# Altium footprint library IS-IG-BB.PcbLib: 6 footprints
Each footprint in its own frame and in the unit in brackets; x right, y up, seen from the top. Pads: shape width x height; smd on the part's side, far side on the other; paste and mask are expansions set on the pad; w line width, h text height; cw(c..) or ccw(c..) is an arc to the next point about the centre after c.
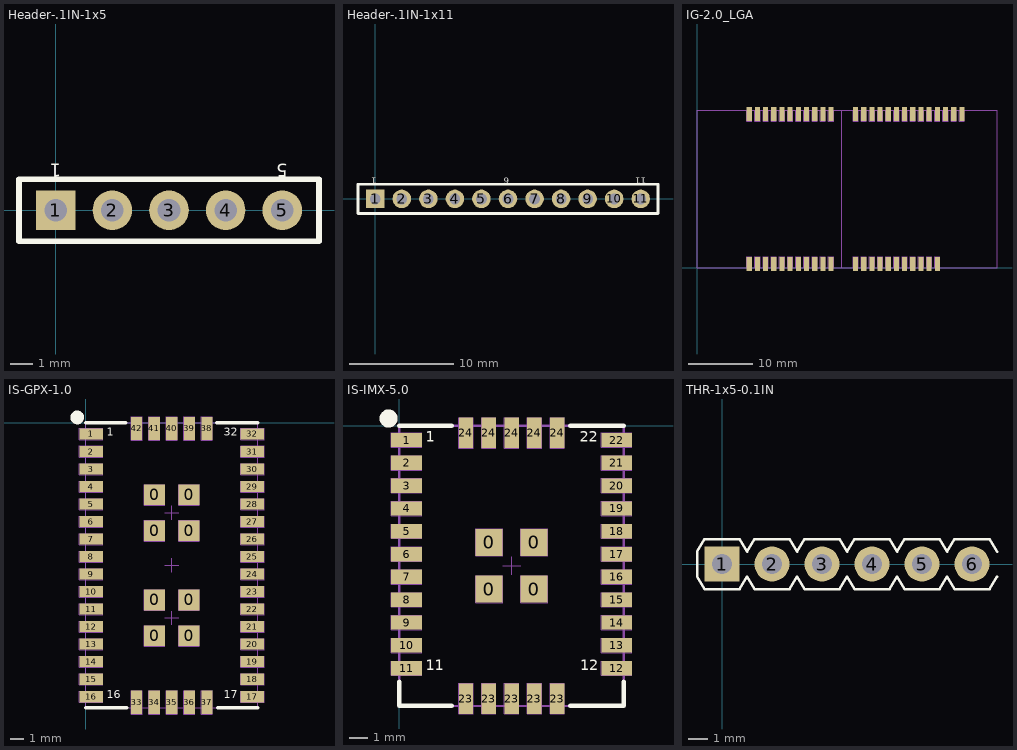
[diagram p0: the footprints below, top view; thin cyan lines are the x and y axes]

## Header-.1IN-1x5 [mil]
pads (5):
  rect 70x70 hole 40: 1(0,0)
  round 70 hole 40: 2(100,0) 3(200,0) 4(300,0) 5(400,0)
Top Overlay:
  lines w10: -65,-55 -65,55 465,55 465,-55 -65,-55
  text "1" at 10,90 h40
  text "5" at 410,90 h40
Bottom Overlay:
  text "1" at -10,90 h40
  text "5" at 395,90 h40
3D body "ESQ-105-13-T-S.step": height 440, standoff -285, extent -60,-50 460,50

## Header-.1IN-1x11 [mil]
pads (11):
  rect 70x70 hole 40: 1(0,0)
  round 70 hole 40: 2(100,0) 3(200,0) 4(300,0) 5(400,0) 6(500,0) 7(600,0) 8(700,0) 9(800,0) 10(900,0) 11(1000,0)
Top Overlay:
  lines w10: -65,-55 1065,-55 1065,55 -65,55 -65,-55
  text "6" at 505,90 h40
  text "1" at 5,90 h40
  text "11" at 1020,90 h40
Bottom Overlay:
  text "6" at 490,90 h40
  text "1" at -10,90 h40
  text "11" at 980,90 h40
3D body "ESQ-111-13-T-S.step": height 440, standoff -285, extent -60,-50 1060,50

## IG-2.0_LGA [mm] "IMX multi-frequency RTK-GNSS Module"
height 5.93
pads (47):
  rect 0.8x2.2 smd paste-2.54: 0(8.123,23.9) 0(8.123,0.6) 0(9.393,23.9) 0(9.393,0.6) 0(10.663,23.9) 0(10.663,0.6) 0(11.933,23.9) 0(11.933,0.6) 0(13.203,23.9) 0(13.203,0.6) 0(14.473,23.9) 0(14.473,0.6) 0(15.743,23.9) 0(15.743,0.6) 0(17.013,23.9) 0(17.013,0.6) 0(18.283,23.9) 0(18.283,0.6) 0(19.553,23.9) 0(19.553,0.6) 0(20.823,23.9) 0(20.823,0.6) 1(41.143,23.9) 2(39.873,23.9) 3(38.603,23.9) 4(37.333,23.9) 5(36.063,23.9) 6(34.793,23.9) 7(33.523,23.9) 8(32.253,23.9) 9(30.983,23.9) 10(29.713,23.9) 11(28.443,23.9) 12(27.173,23.9) 13(25.903,23.9) 14(24.633,23.9) 15(24.633,0.6) 16(25.903,0.6) 17(27.173,0.6) 18(28.443,0.6) 19(29.713,0.6) 20(30.983,0.6) 21(32.253,0.6) 22(33.523,0.6) 23(34.793,0.6) 24(36.063,0.6) 25(37.333,0.6)
Mechanical 13:
  lines w0.127: 22.493,0 22.493,24.5 ; 0,0 0,24.5 46.6,24.5 46.6,0 0,0
Mechanical 16:
  drawing of 294 lines, arcs and shapes, not listed
3D body "IG-2.0.step": height 5.95, standoff 0.01, extent 0,-1.188 46.6,24.5

## IS-GPX-1.0 [mm] "Inerial Sense GPX-1.0, 42pins 1.27mm pitch"
height 2.86
pads (50):
  rect 1.5x1.5 smd: 0(5,-15.435) 0(5,-12.835) 0(5,-7.815) 0(5,-5.215) 0(7.5,-15.435) 0(7.5,-12.835) 0(7.5,-7.815) 0(7.5,-5.215)
  rect 1.7x0.8 smd paste-2.54: 1(0.4,-0.8) 2(0.4,-2.07) 3(0.4,-3.34) 4(0.4,-4.61) 5(0.4,-5.88) 6(0.4,-7.15) 7(0.4,-8.42) 8(0.4,-9.69) 9(0.4,-10.96) 10(0.4,-12.23) 11(0.4,-13.5) 12(0.4,-14.77) 13(0.4,-16.04) 14(0.4,-17.31) 15(0.4,-18.58) 16(0.4,-19.85) 17(12.1,-19.85) 18(12.1,-18.58) 19(12.1,-17.31) 20(12.1,-16.04) 21(12.1,-14.77) 22(12.1,-13.5) 23(12.1,-12.23) 24(12.1,-10.96) 25(12.1,-9.69) 26(12.1,-8.42) 27(12.1,-7.15) 28(12.1,-5.88) 29(12.1,-4.61) 30(12.1,-3.34) 31(12.1,-2.07) 32(12.1,-0.8)
  rect 0.8x1.7 smd paste-2.54: 33(3.71,-20.25) 34(4.98,-20.25) 35(6.25,-20.25) 36(7.52,-20.25) 37(8.79,-20.25) 38(8.79,-0.4) 39(7.52,-0.4) 40(6.25,-0.4) 41(4.98,-0.4) 42(3.71,-0.4)
Top Overlay:
  circle w0.5: c-0.6,0.4 r0.25
  lines w0.254: 0,-20.65 2.975,-20.65 ; 0,0 2.921,0 ; 9.525,0 12.5,0 ; 9.579,-20.65 12.5,-20.65
  text "1" at 1.524,-1.143 h1.02
  text "16" at 1.524,-20.193 h1.02
  text "17" at 10.033,-20.193 h1.02
  text "32" at 10.033,-1.143 h1.02
Mechanical 13:
  lines w0.05: 5.75,-10.325 6.75,-10.325 ; 5.75,-6.515 6.75,-6.515 ; 6.25,-10.825 6.25,-9.825 ; 6.25,-7.015 6.25,-6.015 ; 0,-20.65 0,0 12.5,0 12.5,-20.65 ; 0,-20.65 12.5,-20.65 ; 0,-20.65 12.5,-20.65 ; 5.75,-14.135 6.75,-14.135 5.75,-14.135 ; 6.25,-14.635 6.25,-13.635 6.25,-14.635
Mechanical 16:
  drawing of 200 lines, arcs and shapes, not listed
3D body "GPX-r1.0.3.step": height 2.88, standoff 0.01, extent 0,-20.65 12.5,0

## IS-IMX-5.0 [mm] "Inerial Sense IMX-5.0, 22pins 1.27mm pitch"
height 2.86
pads (36):
  rect 1.5x1.5 smd: 0(5,-9.1) 0(5,-6.5) 0(7.5,-9.1) 0(7.5,-6.5)
  rect 1.7x0.8 smd paste-2.54: 1(0.4,-0.8) 2(0.4,-2.07) 3(0.4,-3.34) 4(0.4,-4.61) 5(0.4,-5.88) 6(0.4,-7.15) 7(0.4,-8.42) 8(0.4,-9.69) 9(0.4,-10.96) 10(0.4,-12.23) 11(0.4,-13.5) 12(12.1,-13.5) 13(12.1,-12.23) 14(12.1,-10.96) 15(12.1,-9.69) 16(12.1,-8.42) 17(12.1,-7.15) 18(12.1,-5.88) 19(12.1,-4.61) 20(12.1,-3.34) 21(12.1,-2.07) 22(12.1,-0.8)
  rect 0.8x1.7 smd paste-2.54: 23(3.71,-15.2) 23(4.98,-15.2) 23(6.25,-15.2) 23(7.52,-15.2) 23(8.79,-15.2) 24(3.71,-0.4) 24(4.98,-0.4) 24(6.25,-0.4) 24(7.52,-0.4) 24(8.79,-0.4)
Top Overlay:
  circle w0.5: c-0.6,0.4 r0.25
  lines w0.254: 0,-14.25 0,-15.6 2.921,-15.6 ; 0,0 2.921,0 ; 9.525,-15.6 12.5,-15.6 ; 9.525,0 12.5,0 ; 12.5,-15.6 12.5,-14.25
  text "22" at 10.048,-1.1 h1.02
  text "12" at 10.075,-13.8 h1.02
  text "11" at 1.473,-13.8 h1.02
  text "1" at 1.473,-1.1 h1.02
Mechanical 13:
  lines w0.05: 5.75,-7.8 6.75,-7.8 ; 6.25,-8.3 6.25,-7.3
  lines w0.127: 0,-15.6 0,0 12.5,0 12.5,-15.6 0,-15.6
Mechanical 16:
  lines w0.025: -0.45,-13.9 -0.45,-13.1 1.25,-13.1 1.25,-13.9 -0.45,-13.9 ; -0.45,-12.63 -0.45,-11.83 1.25,-11.83 1.25,-12.63 -0.45,-12.63 ; -0.45,-11.36 -0.45,-10.56 1.25,-10.56 1.25,-11.36 -0.45,-11.36 ; -0.45,-10.09 -0.45,-9.29 1.25,-9.29 1.25,-10.09 -0.45,-10.09 ; -0.45,-8.82 -0.45,-8.02 1.25,-8.02 1.25,-8.82 -0.45,-8.82 ; -0.45,-7.55 -0.45,-6.75 1.25,-6.75 1.25,-7.55 -0.45,-7.55 ; -0.45,-6.28 -0.45,-5.48 1.25,-5.48 1.25,-6.28 -0.45,-6.28 ; -0.45,-5.01 -0.45,-4.21 1.25,-4.21 1.25,-5.01 -0.45,-5.01 ; -0.45,-3.74 -0.45,-2.94 1.25,-2.94 1.25,-3.74 -0.45,-3.74 ; -0.45,-2.47 -0.45,-1.67 1.25,-1.67 1.25,-2.47 -0.45,-2.47 ; -0.45,-1.2 -0.45,-0.4 1.25,-0.4 1.25,-1.2 -0.45,-1.2 ; 3.31,-16.05 4.11,-16.05 4.11,-14.35 3.31,-14.35 3.31,-16.05 ; 3.31,-1.25 3.31,0.45 4.11,0.45 4.11,-1.25 3.31,-1.25 ; 4.25,-9.85 5.75,-9.85 5.75,-8.35 4.25,-8.35 4.25,-9.85 ; 4.25,-7.25 5.75,-7.25 5.75,-5.75 4.25,-5.75 4.25,-7.25 ; 4.58,-16.05 5.38,-16.05 5.38,-14.35 4.58,-14.35 4.58,-16.05 ; 4.58,-1.25 4.58,0.45 5.38,0.45 5.38,-1.25 4.58,-1.25 ; 5.85,-16.05 6.65,-16.05 6.65,-14.35 5.85,-14.35 5.85,-16.05 ; 5.85,-1.25 5.85,0.45 6.65,0.45 6.65,-1.25 5.85,-1.25 ; 6.75,-9.85 6.75,-8.35 8.25,-8.35 8.25,-9.85 6.75,-9.85 ; 6.75,-7.25 6.75,-5.75 8.25,-5.75 8.25,-7.25 6.75,-7.25 ; 7.12,-16.05 7.92,-16.05 7.92,-14.35 7.12,-14.35 7.12,-16.05 ; 7.12,-1.25 7.12,0.45 7.92,0.45 7.92,-1.25 7.12,-1.25 ; 8.39,-16.05 9.19,-16.05 9.19,-14.35 8.39,-14.35 8.39,-16.05 ; 8.39,-1.25 8.39,0.45 9.19,0.45 9.19,-1.25 8.39,-1.25 ; 11.25,-13.9 12.95,-13.9 12.95,-13.1 11.25,-13.1 11.25,-13.9 ; 11.25,-12.63 12.95,-12.63 12.95,-11.83 11.25,-11.83 11.25,-12.63 ; 11.25,-11.36 12.95,-11.36 12.95,-10.56 11.25,-10.56 11.25,-11.36 ; 11.25,-10.09 12.95,-10.09 12.95,-9.29 11.25,-9.29 11.25,-10.09 ; 11.25,-8.82 12.95,-8.82 12.95,-8.02 11.25,-8.02 11.25,-8.82 ; 11.25,-7.55 12.95,-7.55 12.95,-6.75 11.25,-6.75 11.25,-7.55 ; 11.25,-6.28 12.95,-6.28 12.95,-5.48 11.25,-5.48 11.25,-6.28 ; 11.25,-5.01 12.95,-5.01 12.95,-4.21 11.25,-4.21 11.25,-5.01 ; 11.25,-3.74 12.95,-3.74 12.95,-2.94 11.25,-2.94 11.25,-3.74 ; 11.25,-2.47 12.95,-2.47 12.95,-1.67 11.25,-1.67 11.25,-2.47 ; 11.25,-1.2 12.95,-1.2 12.95,-0.4 11.25,-0.4 11.25,-1.2
3D body "IMX-5.0.5.step": height 2.89, standoff 0.01, extent 0,-15.6 12.5,0

## THR-1x5-0.1IN [mil] "Through Hold 0.1 Inch Pitch Header"
pads (6):
  rect 70x70 hole 40: 1(0,0)
  round 70 hole 40: 2(100,0) 3(200,0) 4(300,0) 5(400,0) 6(500,0)
Top Overlay:
  lines w5: 550,-25 535,-50 465,-50 450,-25 435,-50 365,-50 350,-25 335,-50 265,-50 250,-25 235,-50 165,-50 150,-25 135,-50 65,-50 50,-25 35,-50 0,-50 -35,-50 -50,-25 -50,25 -35,50 0,50 35,50 50,25 65,50 135,50 150,25 165,50 235,50 250,25 265,50 335,50 350,25 365,50 435,50 450,25 465,50 535,50 550,25